# Altium footprint library MyPcbLib.PcbLib: 278 footprints (part 13 of 18)
Each footprint in its own frame and in the unit in brackets; x right, y up, seen from the top. Pads: shape width x height; smd on the part's side, far side on the other; paste and mask are expansions set on the pad; w line width, h text height; cw(c..) or ccw(c..) is an arc to the next point about the centre after c.
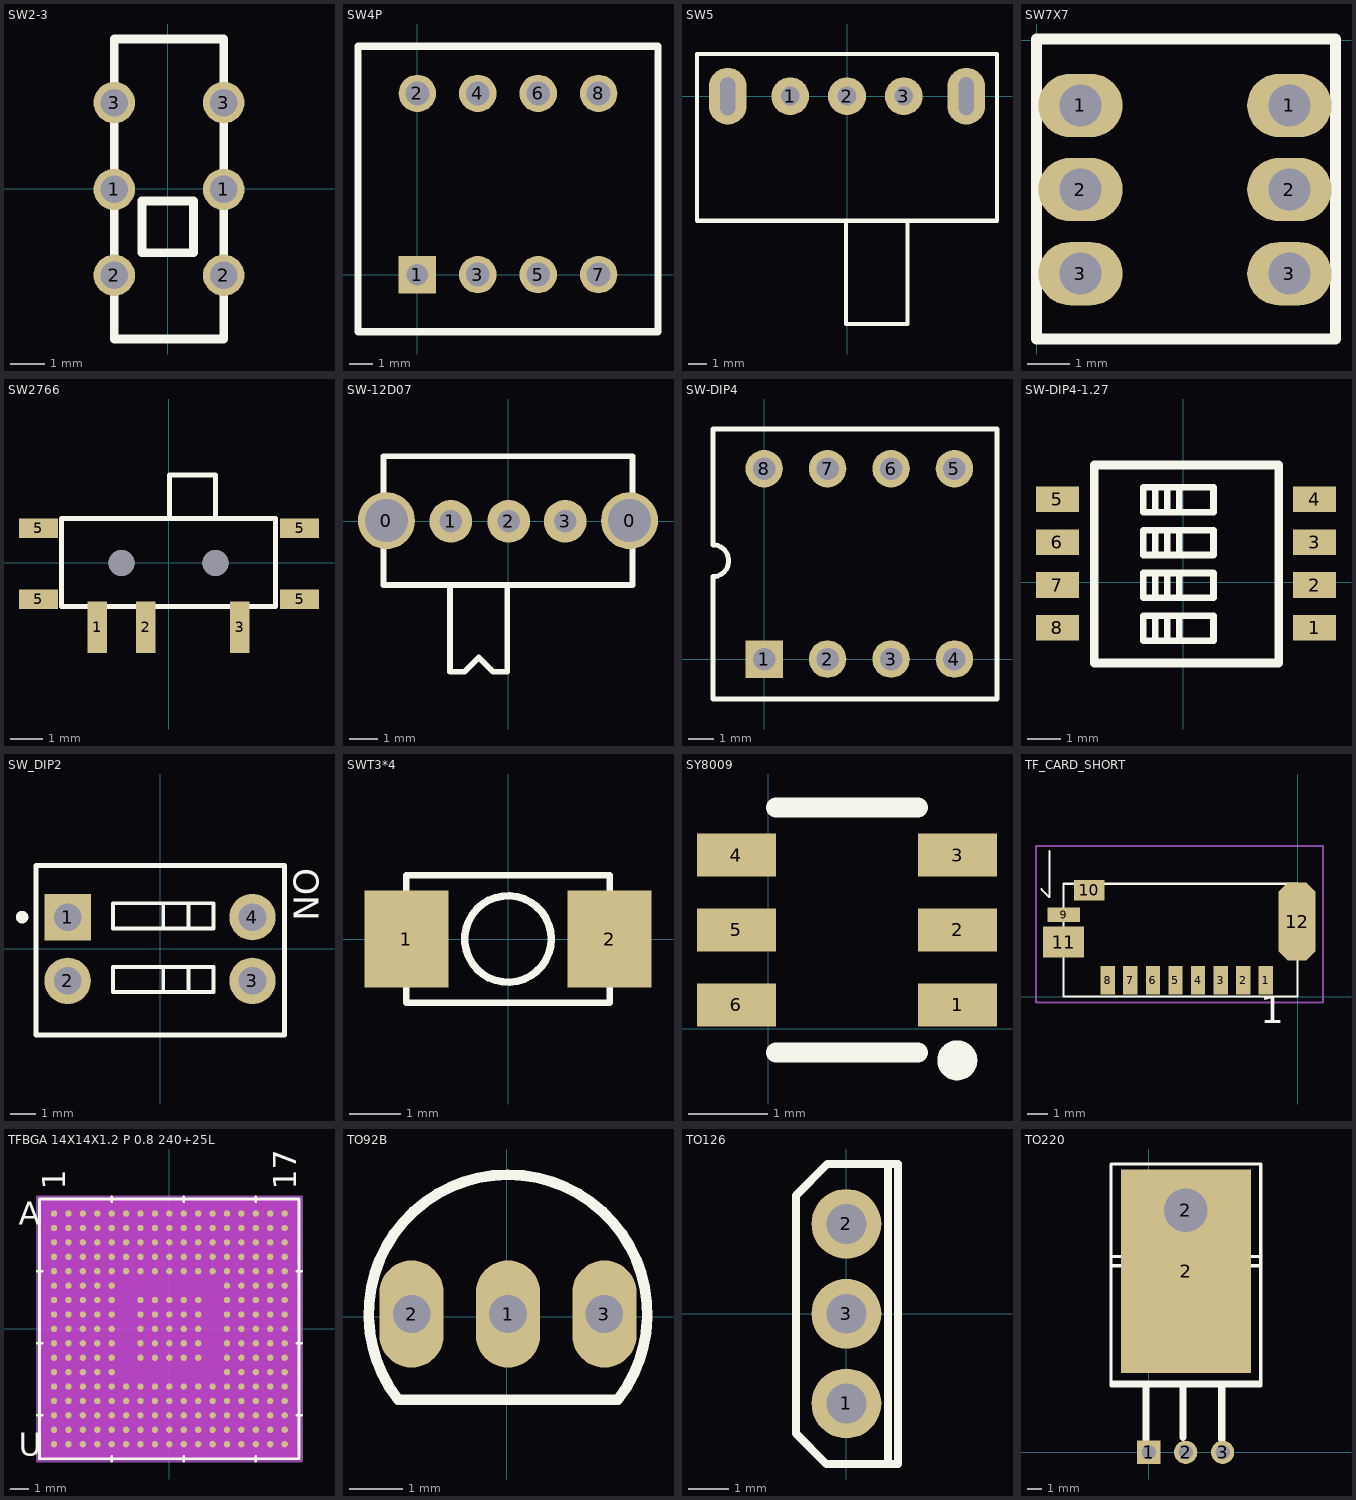
[diagram p12: the footprints below, top view; thin cyan lines are the x and y axes]

## SW2-3 [mm]
pads (6):
  round 1.2 hole 0.8: 1(-1.549,-0.025) 1(1.626,-0.025) 2(-1.549,-2.515) 2(1.626,-2.515) 3(-1.549,2.489) 3(1.626,2.489)
Top Overlay:
  lines w0.254: -1.549,-4.363 1.626,-4.363 1.626,4.337 -1.549,4.337 -1.549,-4.363 ; -0.748,-1.863 0.752,-1.863 0.752,-0.363 -0.748,-0.363 -0.748,-1.863
3D body "CK_Slide (2).STEP": height 5.5, standoff -2.95, extent -1.749,-4.551 1.851,4.449

## SW4P [mil]
pads (8):
  rect 62x62 hole 35.43: 1(0,0)
  round 62 hole 39.37: 2(0,300) 3(100,0) 4(100,300) 5(200,0) 6(200,300) 7(300,0) 8(300,300)
Top Overlay:
  lines w12: -98.43,-94.49 -98.43,377.95 398.43,377.95 398.43,-94.49 -98.43,-94.49
3D body "SWDIP4.stp": height 409.45, standoff -118.11, extent -81.7,-133.46 379.72,362.6

## SW5 [mm]
pads (5):
  round 2 hole 1: 1(-3,0) 2(0,0) 3(3,0)
  oval 2x3 hole 0.8 slot 2 at 90 deg: ""(-6.3,0) ""(6.3,0)
Top Overlay:
  lines w0.203: -0.051,-6.579 -0.051,-12.04 3.2,-12.04 3.2,-6.579
  lines w0.22: -7.925,-6.579 7.925,-6.579 7.925,2.235 -7.925,2.235 -7.925,-6.579
3D body "bodongkuaiguan.STEP": height 6.25, standoff -2.85, extent -6.489,-12.266 6.511,0.634

## SW7X7 [mm]
pads (6):
  oval 2x1.5 hole 1: 1(1.041,-1.549) 1(5.994,-1.549) 2(1.041,-3.543) 2(5.994,-3.543) 3(1.041,-5.537) 3(5.994,-5.537)
Top Overlay:
  lines w0.254: 0,-7.087 7.087,-7.087 7.087,0.025 0,0.025 0,-7.087
3D body "button with fixation.step": height 13, standoff -4, extent -0.02,-7.087 6.98,-0.087

## SW2766 [mm]
pads (7):
  rect 0.6x1.6 smd: 1(-2.2,-1.981) 2(-0.7,-1.981) 3(2.2,-1.981)
  rect 1.2x0.6 smd: 5(-4.013,-1.118) 5(-4.013,1.067) 5(4.039,-1.118) 5(4.039,1.067)
via 1.45,0 diameter 0.8 hole 0.8
via -1.45,0 diameter 0.8 hole 0.8
Top Overlay:
  lines w0.152: 0.025,1.422 0.025,2.718 1.448,2.718 1.448,1.422 ; -3.302,-1.346 -3.302,1.372 3.302,1.372 3.302,-1.346 -3.302,-1.346
3D body "MiniSwitch.step": height 1.4, standoff -0.5, extent -3.85,-2.255 3.85,2.545

## SW-12D07 [mm] "SK12D07"
pads (5):
  round 2 hole 1.5: 0(-4.267,0.025) 0(4.267,0.025)
  round 1.5 hole 0.8: 1(-2.007,0) 2(0.025,0) 3(2.007,0)
Top Overlay:
  lines w0.203: -4.369,-2.235 -4.369,2.286 4.369,2.286 4.369,-2.235 -4.369,-2.235 ; -2.032,-5.283 -1.53,-5.283 -1.029,-4.782 -0.527,-5.283 -0.025,-5.283 -0.025,-2.235 -2.032,-2.235 -2.032,-5.182 -2.032,-5.283
3D body "User Library-CK_Slide.step": height 5, standoff -2.49, extent -4.318,-6.167 4.293,2.205

## SW-DIP4 [mm] "DIP; 16 Leads; Row Spacing 7.62 mm; Pitch 2.54 mm"
pads (8):
  rect 1.5x1.5 hole 0.9: 1(0,0)
  round 1.5 hole 0.9: 2(2.54,0) 3(5.08,0) 4(7.62,0) 5(7.62,7.62) 6(5.08,7.62) 7(2.54,7.62) 8(0,7.62)
Top Overlay:
  lines w0.2: -2.05,4.57 cw(c-2.05,3.935) -2.05,3.3 -2.05,-1.59 9.322,-1.59 9.322,9.2 -2.05,9.2 -2.05,4.6
3D body "User Library-DIPSW8.step": height 7.52, standoff -2.57, extent -1.93,-1.041 9.5,8.611

## SW-DIP4-1.27 [mil]
pads (8):
  rect 50x29.92 smd: 1(153,-53) 2(153,-3) 3(153,47) 4(153,97) 5(-147,97) 6(-147,47) 7(-147,-3) 8(-147,-53)
Top Overlay:
  lines w7.87: -33,-67 -33,-39 ; -33,-17 -33,11 ; -33,33 -33,61 ; -33,83 -33,111 ; -19,-68 -19,-42 ; -19,-18 -19,8 ; -19,32 -19,58 ; -19,82 -19,108 ; -5,-64 -5,-42 ; -5,-14 -5,8 ; -5,36 -5,58 ; -5,86 -5,108 ; -47,-68 -47,-39 35,-39 35,-68 -47,-68 ; -47,-18 -47,11 35,11 35,-18 -47,-18 ; -47,32 35,32 35,61 -47,61 -47,32 ; -47,82 -47,111 35,111 35,82 -47,82
  lines w10: -104,-94 -104,137 111,137 111,-94 -104,-94
3D body "User Library-Diptronics_DHN4.STEP": height 59.06, standoff 0, extent -135.67,-103.21 139,145.21

## SW_DIP2 [mm] "DIP Switch; 16 Leads"
height 5.06
pads (4):
  rect 1.85x1.85 hole 1.1: 1(-3.683,1.27)
  round 1.85 hole 1.1: 2(-3.683,-1.27) 3(3.683,-1.27) 4(3.683,1.27)
Top Overlay:
  circle w0.25: c-5.496,1.271 r0.125
  lines w0.152: 0.127,-1.719 0.127,-0.719 ; 0.127,0.821 0.127,1.821 ; 1.127,-1.719 1.127,-0.719 ; 1.127,0.821 1.127,1.821 ; -1.873,-1.719 2.127,-1.719 2.127,-0.719 -1.873,-0.719 -1.873,-1.719 ; -1.873,0.821 2.127,0.821 2.127,1.821 -1.873,1.821 -1.873,0.821
  lines w0.2: -4.94,-3.429 -4.94,3.327 4.953,3.327 4.953,-3.429 -4.94,-3.429
  text "ON" at 5.334,3.226 h1
3D body "19619.stp": height 10.3, standoff 0, extent -5.001,-3.396 4.899,3.244

## SWT3*4 [mm]
pads (2):
  rect 1.65x1.9 smd: 1(-2,0) 2(2,0)
Top Overlay:
  circle w0.15: c0,0 r0.85
  lines w0.127: -2,-1.25 2,-1.25 2,1.25 -2,1.25 -2,-1.25
3D body "KEY-SMD3x4.STEP": height 2, standoff 0, extent -2.45,-1.452 2.45,1.448

## SY8009 [mm]
pads (6):
  rect 1x0.55 smd: 1(2.4,0.3) 2(2.4,1.25) 3(2.4,2.2) 4(-0.4,2.2) 5(-0.4,1.25) 6(-0.4,0.3)
Top Overlay:
  circle w0.254: c2.397,-0.401 r0.127
  lines w0.254: 0.1,-0.3 1.9,-0.3 ; 0.1,2.8 1.9,2.8
Mechanical 15:
  circle w0.2: c2.4,0.3 r0.1

## TF_CARD_SHORT [mm]
height 1
pads (12):
  rect 0.7x1.4 smd: 1(-1.55,0.8) 2(-2.65,0.8) 3(-3.75,0.8) 4(-4.85,0.8) 5(-5.95,0.8) 6(-7.05,0.8) 7(-8.15,0.8) 8(-9.25,0.8)
  rect 1.58x0.7 smd: 9(-11.399,3.991)
  rect 1.5x1 smd: 10(-10.16,5.182)
  rect 2x1.5 smd: 11(-11.41,2.66)
  oct 1.8x3.8 smd: 12(-0.025,3.658)
Top Overlay:
  lines w0.1: -12.49,5.238 -12.104,4.851 -12.104,7.107 ; -11.41,0 -11.41,5.5 0,5.5 0,0 -11.41,0
  text "1" at -1.829,-1.727 h2.29
Mechanical 15:
  lines w0.1: -12.751,-0.279 -12.751,7.341 1.245,7.341 1.245,-0.279 -12.751,-0.279

## TFBGA 14X14X1.2 P 0.8 240+25L [mil]
pads (265):
  round 14 smd paste+0 mask+0: A1(-251.97,251.97) A2(-220.47,251.97) A3(-188.98,251.97) A4(-157.48,251.97) A5(-125.98,251.97) A6(-94.49,251.97) A7(-62.99,251.97) A8(-31.5,251.97) A9(0,251.97) A10(31.5,251.97) A11(62.99,251.97) A12(94.49,251.97) A13(125.98,251.97) A14(157.48,251.97) A15(188.98,251.97) A16(220.47,251.97) A17(251.97,251.97) B1(-251.97,220.47) B2(-220.47,220.47) B3(-188.98,220.47) B4(-157.48,220.47) B5(-125.98,220.47) B6(-94.49,220.47) B7(-62.99,220.47) B8(-31.5,220.47) B9(0,220.47) B10(31.5,220.47) B11(62.99,220.47) B12(94.49,220.47) B13(125.98,220.47) B14(157.48,220.47) B15(188.98,220.47) B16(220.47,220.47) B17(251.97,220.47) C1(-251.97,188.98) C2(-220.47,188.98) C3(-188.98,188.98) C4(-157.48,188.98) C5(-125.98,188.98) C6(-94.49,188.98) C7(-62.99,188.98) C8(-31.5,188.98) C9(0,188.98) C10(31.5,188.98) C11(62.99,188.98) C12(94.49,188.98) C13(125.98,188.98) C14(157.48,188.98) C15(188.98,188.98) C16(220.47,188.98) C17(251.97,188.98) D1(-251.97,157.48) D2(-220.47,157.48) D3(-188.98,157.48) D4(-157.48,157.48) D5(-125.98,157.48) D6(-94.49,157.48) D7(-62.99,157.48) D8(-31.5,157.48) D9(0,157.48) D10(31.5,157.48) D11(62.99,157.48) D12(94.49,157.48) D13(125.98,157.48) D14(157.48,157.48) D15(188.98,157.48) D16(220.47,157.48) D17(251.97,157.48) E1(-251.97,125.98) E2(-220.47,125.98) E3(-188.98,125.98) E4(-157.48,125.98) E5(-125.98,125.98) E6(-94.49,125.98) E7(-62.99,125.98) E8(-31.5,125.98) E9(0,125.98) E10(31.5,125.98) E11(62.99,125.98) E12(94.49,125.98) E13(125.98,125.98) E14(157.48,125.98) E15(188.98,125.98) E16(220.47,125.98) E17(251.97,125.98) F1(-251.97,94.49) F2(-220.47,94.49) F3(-188.98,94.49) F4(-157.48,94.49) F5(-125.98,94.49) F13(125.98,94.49) F14(157.48,94.49) F15(188.98,94.49) F16(220.47,94.49) F17(251.97,94.49) G1(-251.97,62.99) G2(-220.47,62.99) G3(-188.98,62.99) G4(-157.48,62.99) G5(-125.98,62.99) G7(-62.99,62.99) G8(-31.5,62.99) G9(0,62.99) G10(31.5,62.99) G11(62.99,62.99) G13(125.98,62.99) G14(157.48,62.99) G15(188.98,62.99) G16(220.47,62.99) G17(251.97,62.99) H1(-251.97,31.5) H2(-220.47,31.5) H3(-188.98,31.5) H4(-157.48,31.5) H5(-125.98,31.5) H7(-62.99,31.5) H8(-31.5,31.5) H9(0,31.5) H10(31.5,31.5) H11(62.99,31.5) H13(125.98,31.5) H14(157.48,31.5) H15(188.98,31.5) H16(220.47,31.5) H17(251.97,31.5) J1(-251.97,0) J2(-220.47,0) J3(-188.98,0) J4(-157.48,0) J5(-125.98,0) J7(-62.99,0) J8(-31.5,0) J9(0,0) J10(31.5,0) J11(62.99,0) J13(125.98,0) J14(157.48,0) J15(188.98,0) J16(220.47,0) J17(251.97,0) K1(-251.97,-31.5) K2(-220.47,-31.5) K3(-188.98,-31.5) K4(-157.48,-31.5) K5(-125.98,-31.5) K7(-62.99,-31.5) K8(-31.5,-31.5) K9(0,-31.5) K10(31.5,-31.5) K11(62.99,-31.5) K13(125.98,-31.5) K14(157.48,-31.5) K15(188.98,-31.5) K16(220.47,-31.5) K17(251.97,-31.5) L1(-251.97,-62.99) L2(-220.47,-62.99) L3(-188.98,-62.99) L4(-157.48,-62.99) L5(-125.98,-62.99) L7(-62.99,-62.99) L8(-31.5,-62.99) L9(0,-62.99) L10(31.5,-62.99) L11(62.99,-62.99) L13(125.98,-62.99) L14(157.48,-62.99) L15(188.98,-62.99) L16(220.47,-62.99) L17(251.97,-62.99) M1(-251.97,-94.49) M2(-220.47,-94.49) M3(-188.98,-94.49) M4(-157.48,-94.49) M5(-125.98,-94.49) M13(125.98,-94.49) M14(157.48,-94.49) M15(188.98,-94.49) M16(220.47,-94.49) M17(251.97,-94.49) N1(-251.97,-125.98) N2(-220.47,-125.98) N3(-188.98,-125.98) N4(-157.48,-125.98) N5(-125.98,-125.98) N6(-94.49,-125.98) N7(-62.99,-125.98) N8(-31.5,-125.98) N9(0,-125.98) N10(31.5,-125.98) N11(62.99,-125.98) N12(94.49,-125.98) N13(125.98,-125.98) N14(157.48,-125.98) N15(188.98,-125.98) N16(220.47,-125.98) N17(251.97,-125.98) P1(-251.97,-157.48) P2(-220.47,-157.48) P3(-188.98,-157.48) P4(-157.48,-157.48) P5(-125.98,-157.48) P6(-94.49,-157.48) P7(-62.99,-157.48) P8(-31.5,-157.48) P9(0,-157.48) P10(31.5,-157.48) P11(62.99,-157.48) P12(94.49,-157.48) P13(125.98,-157.48) P14(157.48,-157.48) P15(188.98,-157.48) P16(220.47,-157.48) P17(251.97,-157.48) R1(-251.97,-188.98) R2(-220.47,-188.98) R3(-188.98,-188.98) R4(-157.48,-188.98) R5(-125.98,-188.98) R6(-94.49,-188.98) R7(-62.99,-188.98) R8(-31.5,-188.98) R9(0,-188.98) R10(31.5,-188.98) R11(62.99,-188.98) R12(94.49,-188.98) R13(125.98,-188.98) R14(157.48,-188.98) R15(188.98,-188.98) R16(220.47,-188.98) R17(251.97,-188.98) T1(-251.97,-220.47) T2(-220.47,-220.47) T3(-188.98,-220.47) T4(-157.48,-220.47) T5(-125.98,-220.47) T6(-94.49,-220.47) T7(-62.99,-220.47) T8(-31.5,-220.47) T9(0,-220.47) T10(31.5,-220.47) T11(62.99,-220.47) T12(94.49,-220.47) T13(125.98,-220.47) T14(157.48,-220.47) T15(188.98,-220.47) T16(220.47,-220.47) T17(251.97,-220.47) U1(-251.97,-251.97) U2(-220.47,-251.97) U3(-188.98,-251.97) U4(-157.48,-251.97) U5(-125.98,-251.97) U6(-94.49,-251.97) U7(-62.99,-251.97) U8(-31.5,-251.97) U9(0,-251.97) U10(31.5,-251.97) U11(62.99,-251.97) U12(94.49,-251.97) U13(125.98,-251.97) U14(157.48,-251.97) U15(188.98,-251.97) U16(220.47,-251.97) U17(251.97,-251.97)
Top Overlay:
  lines w6: -288.5,-188.98 -278.5,-188.98 ; -288.5,-31.5 -278.5,-31.5 ; -288.5,125.98 -278.5,125.98 ; -125.98,-288.5 -125.98,-278.5 ; -125.98,278.5 -125.98,288.5 ; 31.5,-288.5 31.5,-278.5 ; 31.5,278.5 31.5,288.5 ; 188.98,-288.5 188.98,-278.5 ; 188.98,278.5 188.98,288.5 ; 278.5,-188.98 288.5,-188.98 ; 278.5,-31.5 288.5,-31.5 ; 278.5,125.98 288.5,125.98 ; -283.5,-283.5 -283.5,283.5 283.5,283.5 283.5,-283.5 -283.5,-283.5
  text "17" at 276.97,303.5 h50
  text "1" at -226.97,303.5 h50
  text "U" at -328.5,-276.97 h50
  text "A" at -328.5,226.97 h50
Bottom Overlay:
  text "17" at 226.97,303.5 h50
  text "1" at -276.97,303.5 h50
  text "U" at -303.5,-276.97 h50
  text "A" at -303.5,226.97 h50
Keep-Out Layer:
  region: -285.22,-285.22 -285.22,285.22 285.22,285.22 285.22,-285.22
Mechanical 13:
  lines w1: -278.5,262.75 -262.75,278.5 ; -278.5,-278.5 -278.5,278.5 278.5,278.5 278.5,-278.5 -278.5,-278.5
  text "17" at 276.97,303.5 h50
  text "1" at -226.97,303.5 h50
  text "U" at -328.5,-276.97 h50
  text "A" at -328.5,226.97 h50
Mechanical 15:
  region: 288.5,-288.5 -288.5,-288.5 -288.5,288.5 288.5,288.5
  lines w6: -288.5,-288.5 288.5,-288.5 288.5,288.5 -288.5,288.5 -288.5,-288.5
3D body "TFBGA14X14X12P08240+25L.step": height 43.11, standoff 0.01, extent -278.5,-278.5 278.5,278.5

## TO92B [mm] "TO, Flat Index; 3 In-Line, Axial Leads; Body Dia. 4.8mm; Leads 0.48 x 0.5 mm (max)"
height 5.33
pads (3):
  oval 1.2x2 hole 0.7: 1(0.025,0.051) 2(-1.775,0.051) 3(1.825,0.051)
Top Overlay:
  lines w0.2: -2.023,-1.55 cw(c0.025,0.051) 2.074,-1.55 ; -1.965,-1.549 2.015,-1.549
3D body "TO-92S.STEP": height 6.1, standoff -4.5, extent -2.271,-1.21 2.321,2.347

## TO126 [mm] "BD135"
pads (3):
  round 1.75 hole 1: 1(0,-2.25) 2(0,2.25) 3(0,0)
Top Overlay:
  lines w0.2: 1.041,-3.734 1.041,3.734 ; -1.268,-3.005 -0.506,-3.767 1.295,-3.767 1.295,3.752 -0.48,3.752 -1.268,2.964 -1.268,-3.005
3D body "BD135 (TO-126 SOT32) v4.step": height 14.6, standoff -3.35, extent -1.797,-3.934 0.903,3.866

## TO220 [mm]
pads (5):
  rect 1.6x1.6 hole 1: 1(0,0)
  round 1.6 hole 1: 2(2.54,0) 3(5.08,0)
  round 4 hole 3: 2(2.54,16.637)
  rect 8.9x14 smd: 2(2.565,12.446)
Top Overlay:
  lines w0.22: -2.591,4.699 7.696,4.699 ; -2.591,4.826 7.696,4.826 ; -2.591,12.827 7.696,12.827 ; -2.591,13.462 7.696,13.462 ; -2.591,19.05 -2.591,19.812 7.696,19.812 7.696,4.572 -2.591,4.572 -2.591,19.558
  lines w0.5: -0.178,0.889 -0.178,4.572 ; 2.362,1.016 2.362,4.699 ; 5.029,0.889 5.029,4.572
3D body "User Library-TO220 L.STEP": height 4.5, standoff -3, extent -2.638,-0.127 7.362,19.577